# Altium footprint library MyPcbLib.PcbLib: 65 footprints (part 4 of 5)
Each footprint in its own frame and in the unit in brackets; x right, y up, seen from the top. Pads: shape width x height; smd on the part's side, far side on the other; paste and mask are expansions set on the pad; w line width, h text height; cw(c..) or ccw(c..) is an arc to the next point about the centre after c.
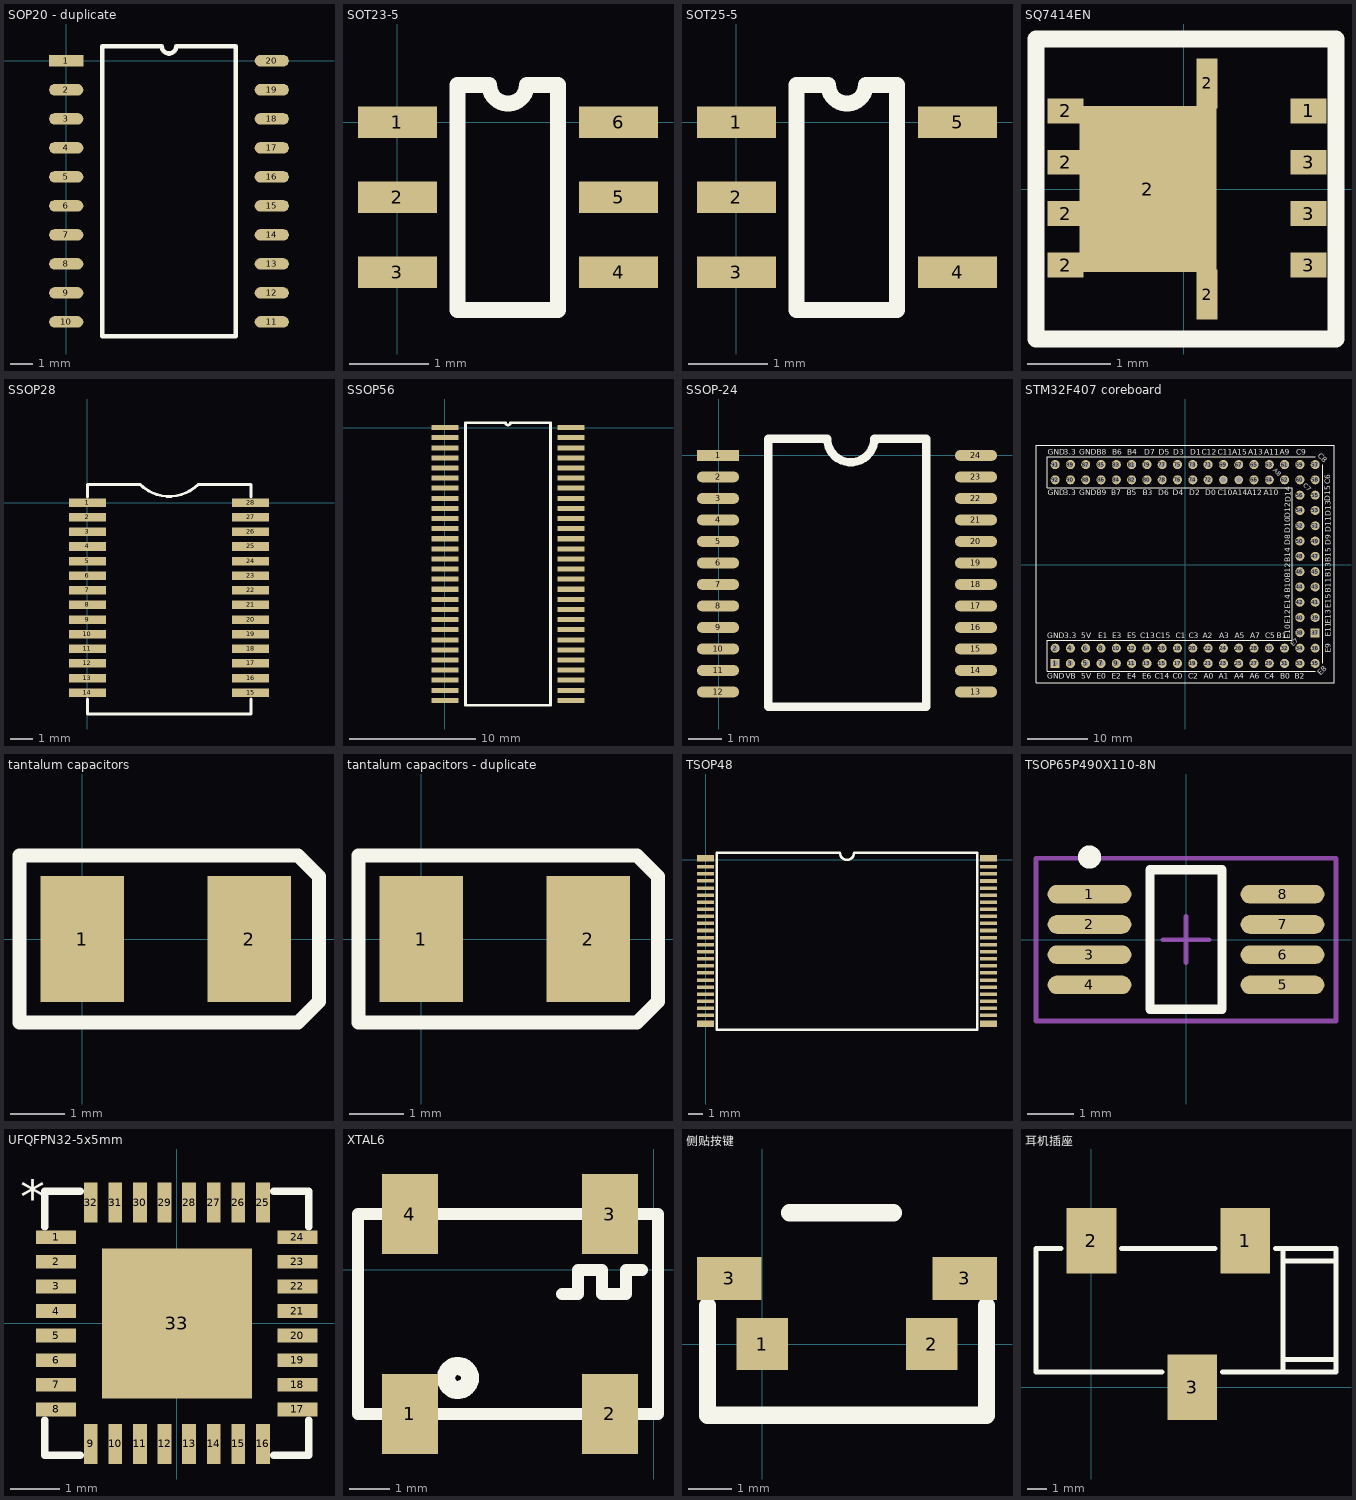
[diagram p3: the footprints below, top view; thin cyan lines are the x and y axes]

## SOP20 - duplicate [mm]
pads (20):
  rect 1.5x0.5 smd: 1(0,0)
  oval 1.5x0.5 smd: 2(0,-1.27) 3(0,-2.54) 4(0,-3.81) 5(0,-5.08) 6(0,-6.35) 7(0,-7.62) 8(0,-8.89) 9(0,-10.16) 10(0,-11.43) 11(9,-11.43) 12(9,-10.16) 13(9,-8.89) 14(9,-7.62) 15(9,-6.35) 16(9,-5.08) 17(9,-3.81) 18(9,-2.54) 19(9,-1.27) 20(9,0)
Top Overlay:
  lines w0.2: 1.585,-12.065 7.415,-12.065 7.415,0.635 4.818,0.635 cw(c4.5,0.635) 4.182,0.635 1.585,0.635 1.585,-12.065

## SOT23-5 [mm]
pads (6):
  rect 1x0.4 smd: 1(0,0) 2(0,-0.95) 3(0,-1.9) 4(2.8,-1.9) 5(2.8,-0.95) 6(2.8,0)
Top Overlay:
  lines w0.2: 0.762,-2.375 0.762,0.475 1.162,0.475 ccw(c1.4,0.475) 1.637,0.475 2.032,0.475 2.032,-2.375 0.762,-2.375

## SOT25-5 [mm]
pads (5):
  rect 1x0.4 smd: 1(0,0) 2(0,-0.95) 3(0,-1.9) 4(2.8,-1.9) 5(2.8,0)
Top Overlay:
  lines w0.2: 0.762,-2.375 2.032,-2.375 2.032,0.475 1.637,0.475 cw(c1.4,0.475) 1.162,0.475 0.762,0.475 0.762,-2.375

## SQ7414EN [mm] "MOS"
pads (11):
  rect 0.43x0.3 smd: 1(1.499,0.94) 2(-1.422,-0.914) 2(-1.422,-0.296) 2(-1.422,0.322) 2(-1.422,0.94) 3(1.499,-0.914) 3(1.499,-0.296) 3(1.499,0.322)
  rect 1.65x2 smd: 2(-0.432,0)
  rect 0.25x0.6 smd: 2(0.279,-1.27) 2(0.279,1.27)
Top Overlay:
  lines w0.2: -1.778,-1.803 -1.778,1.803 1.829,1.803 1.829,-1.803 -1.778,-1.803

## SSOP28 [mil]
height 62.99
pads (28):
  rect 65x15 smd: 1(0,0) 2(0,-25.59) 3(0,-51.18) 4(0,-76.77) 5(0,-102.36) 6(0,-127.95) 7(0,-153.54) 8(0,-179.13) 9(0,-204.72) 10(0,-230.31) 11(0,-255.91) 12(0,-281.5) 13(0,-307.09) 14(0,-332.68) 15(285.43,-332.68) 16(285.43,-307.09) 17(285.43,-281.5) 18(285.43,-255.91) 19(285.43,-230.31) 20(285.43,-204.72) 21(285.43,-179.13) 22(285.43,-153.54) 23(285.43,-127.95) 24(285.43,-102.36) 25(285.43,-76.77) 26(285.43,-51.18) 27(285.43,-25.59) 28(285.43,0)
Top Overlay:
  lines w5: 0,-344 0,-370.03 286,-370.03 286,-344 ; 0,10 0,32 92,32 ccw(c143,83) 194,32 286,32 286,10

## SSOP56 [mm]
pads (56):
  rect 2.15x0.4 smd: 1(0,0) 2(0,-0.8) 3(0,-1.6) 4(0,-2.4) 5(0,-3.2) 6(0,-4) 7(0,-4.8) 8(0,-5.6) 9(0,-6.4) 10(0,-7.2) 11(0,-8) 12(0,-8.8) 13(0,-9.6) 14(0,-10.4) 15(0,-11.2) 16(0,-12) 17(0,-12.8) 18(0,-13.6) 19(0,-14.4) 20(0,-15.2) 21(0,-16) 22(0,-16.8) 23(0,-17.6) 24(0,-18.4) 25(0,-19.2) 26(0,-20) 27(0,-20.8) 28(0,-21.6) 29(10,-21.6) 30(10,-20.8) 31(10,-20) 32(10,-19.2) 33(10,-18.4) 34(10,-17.6) 35(10,-16.8) 36(10,-16) 37(10,-15.2) 38(10,-14.4) 39(10,-13.6) 40(10,-12.8) 41(10,-12) 42(10,-11.2) 43(10,-10.4) 44(10,-9.6) 45(10,-8.8) 46(10,-8) 47(10,-7.2) 48(10,-6.4) 49(10,-5.6) 50(10,-4.8) 51(10,-4) 52(10,-3.2) 53(10,-2.4) 54(10,-1.6) 55(10,-0.8) 56(10,0)
Top Overlay:
  lines w0.2: 1.635,-22 8.365,-22 8.365,0.4 5.2,0.4 cw(c5,0.4) 4.8,0.4 1.635,0.4 1.635,-22

## SSOP-24 [mm]
pads (24):
  rect 1.27x0.33 smd: 1(-0.025,0)
  oval 1.27x0.33 smd: 2(-0.025,-0.65) 3(-0.025,-1.3) 4(-0.025,-1.95) 5(-0.025,-2.6) 6(-0.025,-3.25) 7(-0.025,-3.9) 8(-0.025,-4.55) 9(-0.025,-5.2) 10(-0.025,-5.85) 11(-0.025,-6.5) 12(-0.025,-7.15) 13(7.775,-7.15) 14(7.775,-6.5) 15(7.775,-5.85) 16(7.775,-5.2) 17(7.775,-4.55) 18(7.775,-3.9) 19(7.775,-3.25) 20(7.775,-2.6) 21(7.775,-1.95) 22(7.775,-1.3) 23(7.775,-0.65) 24(7.775,0)
Top Overlay:
  lines w0.254: 6.223,-7.6 1.499,-7.6 1.499,0.5 3.269,0.5 3.277,0.508 ccw(c3.99,0.508) 4.703,0.508 6.266,0.508 6.274,0.5 6.274,-7.6

## STM32F407 coreboard [mm]
pads (92):
  rect 1.5x1.5 hole 0.9: 1(-21.641,-16.383) 37(21.539,-11.303)
  round 1.5 hole 0.9: 2(-21.641,-13.843) 3(-19.101,-16.383) 4(-19.101,-13.843) 5(-16.561,-16.383) 6(-16.561,-13.843) 7(-14.021,-16.383) 8(-14.021,-13.843) 9(-11.481,-16.383) 10(-11.481,-13.843) 11(-8.941,-16.383) 12(-8.941,-13.843) 13(-6.401,-16.383) 14(-6.401,-13.843) 15(-3.861,-16.383) 16(-3.861,-13.843) 17(-1.321,-16.383) 18(-1.321,-13.843) 19(1.219,-16.383) 20(1.219,-13.843) 21(3.759,-16.383) 22(3.759,-13.843) 23(6.299,-16.383) 24(6.299,-13.843) 25(8.839,-16.383) 26(8.839,-13.843) 27(11.379,-16.383) 28(11.379,-13.843) 29(13.919,-16.383) 30(13.919,-13.843) 31(16.459,-16.383) 32(16.459,-13.843) 33(18.999,-16.383) 34(18.999,-13.843) 35(21.539,-16.383) 36(21.539,-13.843) 38(18.999,-11.303) 39(21.539,-8.763) 40(18.999,-8.763) 41(21.539,-6.223) 42(18.999,-6.223) 43(21.539,-3.683) 44(18.999,-3.683) 45(21.539,-1.143) 46(18.999,-1.143) 47(21.539,1.397) 48(18.999,1.397) 49(21.539,3.937) 50(18.999,3.937) 51(21.539,6.477) 52(18.999,6.477) 53(21.539,9.017) 54(18.999,9.017) 55(21.539,11.557) 56(18.999,11.557) 57(21.539,16.637) 58(21.539,14.097) 59(18.999,16.637) 60(18.999,14.097) 61(16.459,16.637) 62(16.459,14.097) 63(13.919,16.637) 64(13.919,14.097) 65(11.379,16.637) 66(11.379,14.097) 67(8.839,16.637) 69(6.299,16.637) 71(3.759,16.637) 72(3.759,14.097) 73(1.219,16.637) 74(1.219,14.097) 75(-1.321,16.637) 76(-1.321,14.097) 77(-3.861,16.637) 78(-3.861,14.097) 79(-6.401,16.637) 80(-6.401,14.097) 81(-8.941,16.637) 82(-8.941,14.097) 83(-11.481,16.637) 84(-11.481,14.097) 85(-14.021,16.637) 86(-14.021,14.097) 87(-16.561,16.637) 88(-16.561,14.097) 89(-19.101,16.637) 90(-19.101,14.097) 91(-21.641,16.637) 92(-21.641,14.097)
  round 1.4 hole 0.9: 68(8.839,14.097) 70(6.299,14.097)
Top Overlay:
  lines w0.2: 21.539,-17.653 -22.911,-17.653 -22.911,-12.573 17.729,-12.573 17.729,-10.668 17.729,12.827 -22.911,12.827 -22.911,17.907 21.539,17.907 ; 22.809,-16.383 22.809,-12.573 22.809,-10.668 22.809,12.827 22.809,16.637
  lines w0.203: -24.816,-19.558 -24.816,19.812 24.714,19.812 24.714,-19.558 -24.816,-19.558
  text "GND" at -22.853,18.288 h0.89
  text "GND" at -22.853,11.557 h0.89
  text "3.3" at -20.186,11.557 h0.89
  text "3.3" at -20.186,18.288 h0.89
  text "GND" at -17.646,18.288 h0.89
  text "GND" at -17.646,11.557 h0.89
  text "GND" at -22.911,-12.192 h0.89
  text "3.3" at -20.117,-12.192 h0.89
  text "5V" at -17.265,-12.192 h0.89
  text "GND" at -22.911,-18.923 h0.89
  text "VB" at -19.863,-18.923 h0.89
  text "5V" at -17.323,-18.923 h0.89
  text "E0" at -14.725,-18.923 h0.89
  text "E1" at -14.471,-12.192 h0.89
  text "E2" at -12.243,-18.923 h0.89
  text "E3" at -12.185,-12.192 h0.89
  text "E4" at -9.703,-18.923 h0.89
  text "E5" at -9.645,-12.192 h0.89
  text "E6" at -7.163,-18.923 h0.89
  text "C13" at -7.486,-12.192 h0.89
  text "C14" at -5.131,-18.923 h0.89
  text "C15" at -4.946,-12.192 h0.89
  text "C0" at -2.083,-18.923 h0.89
  text "C1" at -1.644,-12.192 h0.89
  text "C2" at 0.457,-18.923 h0.89
  text "C3" at 0.515,-12.192 h0.89
  text "A0" at 2.997,-18.923 h0.89
  text "A1" at 5.537,-18.923 h0.89
  text "A2" at 2.873,-12.192 h0.89
  text "A3" at 5.595,-12.192 h0.89
  text "A4" at 8.077,-18.923 h0.89
  text "A5" at 8.2,-12.192 h0.89
  text "A6" at 10.675,-18.923 h0.89
  text "A7" at 10.75,-12.192 h0.89
  text "C4" at 13.157,-18.923 h0.89
  text "C5" at 13.215,-12.192 h0.89
  text "B0" at 15.755,-18.923 h0.89
  text "B1" at 15.189,-12.192 h0.89
  text "B2" at 18.168,-18.923 h0.89
  text "E7" at 17.914,-13.589 h0.76
  text "E8" at 22.486,-18.415 h0.89
  text "E9" at 24.105,-14.63 h0.89
  text "E11" at 24.105,-11.972 h0.89
  text "E10" at 17.399,-12.268 h0.89
  text "E13" at 24.105,-9.83 h0.89
  text "E12" at 17.399,-9.83 h0.89
  text "E15" at 24.105,-7.188 h0.89
  text "E14" at 17.399,-7.264 h0.89
  text "B11" at 24.105,-4.674 h0.89
  text "B10" at 17.399,-4.623 h0.89
  text "D9" at 24.105,3.277 h0.89
  text "D8" at 17.399,3.251 h0.89
  text "D11" at 24.105,5.41 h0.89
  text "D10" at 17.399,5.207 h0.89
  text "D13" at 24.105,8.052 h0.89
  text "D12" at 17.399,7.722 h0.89
  text "D14" at 17.475,10.414 h0.89
  text "D15" at 24.079,10.541 h0.89
  text "C6" at 24.079,13.335 h0.89
  text "C8" at 21.851,18.034 h0.89
  text "C7" at 19.507,13.081 h0.76
  text "C9" at 18.422,18.288 h0.89
  text "A8" at 14.485,15.621 h0.76
  text "A9" at 15.628,18.288 h0.89
  text "A10" at 12.979,11.557 h0.89
  text "A11" at 13.088,18.288 h0.89
  text "A12" at 10.294,11.557 h0.89
  text "A13" at 10.421,18.288 h0.89
  text "A14" at 7.881,11.557 h0.89
  text "A15" at 7.754,18.288 h0.89
  text "C10" at 5.341,11.557 h0.89
  text "C11" at 5.341,18.288 h0.89
  text "C12" at 2.674,18.288 h0.89
  text "D0" at 3.251,11.557 h0.89
  text "D1" at 0.769,18.288 h0.89
  text "D2" at 0.642,11.557 h0.89
  text "D3" at -2.025,18.288 h0.89
  text "D4" at -2.074,11.557 h0.89
  text "D5" at -4.438,18.288 h0.89
  text "D6" at -4.496,11.557 h0.89
  text "D7" at -6.851,18.288 h0.89
  text "B3" at -7.091,11.557 h0.89
  text "B4" at -9.645,18.288 h0.89
  text "B5" at -9.772,11.557 h0.89
  text "B6" at -12.185,18.288 h0.89
  text "B7" at -12.288,11.557 h0.89
  text "B8" at -14.725,18.288 h0.89
  text "B9" at -14.725,11.557 h0.89
  text "B13" at 24.105,-2.108 h0.89
  text "B12" at 17.399,-2.184 h0.89
  text "B15" at 24.105,0.457 h0.89
  text "B14" at 17.399,0.406 h0.89

## tantalum capacitors [mil]
pads (2):
  rect 60x90.55 smd: 1(0,0) 2(120,0)
Top Overlay:
  lines w10: -45,-60 155,-60 170,-45 170,45 155,60 -45,60 -45,-60

## tantalum capacitors - duplicate [mil]
pads (2):
  rect 60x90.55 smd: 1(0,0) 2(120,0)
Top Overlay:
  lines w10: -45,-60 -45,60 155,60 170,45 170,-45 155,-60 -45,-60

## TSOP48 [mm]
pads (48):
  rect 1.2x0.45 smd: 1(-0.021,0.108) 24(-0.021,-11.592) 25(19.979,-11.592) 48(19.979,0.108)
  rect 1.2x0.25 smd: 2(-0.021,-0.492) 3(-0.021,-0.992) 4(-0.021,-1.492) 5(-0.021,-1.992) 6(-0.021,-2.492) 7(-0.021,-2.992) 8(-0.021,-3.492) 9(-0.021,-3.992) 10(-0.021,-4.492) 11(-0.021,-4.992) 12(-0.021,-5.492) 13(-0.021,-5.992) 14(-0.021,-6.492) 15(-0.021,-6.992) 16(-0.021,-7.492) 17(-0.021,-7.992) 18(-0.021,-8.492) 19(-0.021,-8.992) 20(-0.021,-9.492) 21(-0.021,-9.992) 22(-0.021,-10.492) 23(-0.021,-10.992) 26(19.979,-10.992) 27(19.979,-10.492) 28(19.979,-9.992) 29(19.979,-9.492) 30(19.979,-8.992) 31(19.979,-8.492) 32(19.979,-7.992) 33(19.979,-7.492) 34(19.979,-6.992) 35(19.979,-6.492) 36(19.979,-5.992) 37(19.979,-5.492) 38(19.979,-4.992) 39(19.979,-4.492) 40(19.979,-3.992) 41(19.979,-3.492) 42(19.979,-2.992) 43(19.979,-2.492) 44(19.979,-1.992) 45(19.979,-1.492) 46(19.979,-0.992) 47(19.979,-0.492)
Top Overlay:
  lines w0.178: 0.779,-11.992 0.779,0.508 9.479,0.508 ccw(c9.979,0.508) 10.479,0.508 19.179,0.508 19.179,-11.992 0.779,-11.992

## TSOP65P490X110-8N [mm] "TSOP, 8-Leads, Body 3.0x3.0mm (max), Pitch 0.65mm, IPC Medium Density"
height 1.1
pads (8):
  oval 1.8x0.4 smd: 1(-2.075,0.975) 2(-2.075,0.325) 3(-2.075,-0.325) 4(-2.075,-0.975) 5(2.075,-0.975) 6(2.075,-0.325) 7(2.075,0.325) 8(2.075,0.975)
Top Overlay:
  circle w0.25: c-2.075,1.775 r0.125
  lines w0.2: -0.775,-1.5 0.775,-1.5 0.775,1.5 -0.775,1.5 -0.775,-1.5
Mechanical 15:
  lines w0.1: -0.5,0 0.5,0 ; 0,-0.5 0,0.5 ; -3.225,-1.75 3.225,-1.75 3.225,1.75 -3.225,1.75 -3.225,-1.75

## UFQFPN32-5x5mm [mil]
pads (33):
  rect 32x11 smd: 1(-96.5,68.9) 2(-96.5,49.21) 3(-96.5,29.53) 4(-96.5,9.84) 5(-96.5,-9.84) 6(-96.5,-29.53) 7(-96.5,-49.21) 8(-96.5,-68.9) 17(96.5,-68.9) 18(96.5,-49.21) 19(96.5,-29.53) 20(96.5,-9.84) 21(96.5,9.84) 22(96.5,29.53) 23(96.5,49.21) 24(96.5,68.9)
  rect 11x32 smd: 9(-68.9,-96.5) 10(-49.21,-96.5) 11(-29.53,-96.5) 12(-9.84,-96.5) 13(9.84,-96.5) 14(29.53,-96.5) 15(49.21,-96.5) 16(68.9,-96.5) 25(68.9,96.5) 26(49.21,96.5) 27(29.53,96.5) 28(9.84,96.5) 29(-9.84,96.5) 30(-29.53,96.5) 31(-49.21,96.5) 32(-68.9,96.5)
  rect 120x120 smd paste-70.5: 33(0,0)
Top Overlay:
  lines w6: -105.5,-77.4 -105.5,-105.5 -77.4,-105.5 ; -105.5,77.4 -105.5,105.5 -77.4,105.5 ; 77.4,-105.5 105.5,-105.5 105.5,-77.4 ; 77.4,105.5 105.5,105.5 105.5,77.4
  text "*" at -125,77.4 h50
Top Paste:
  region: 67.06,-3.94 3.94,-3.94 3.94,-67.06 67.06,-67.06
  region: 67.06,67.06 3.94,67.06 3.94,3.94 67.06,3.94
  region: -3.94,-3.94 -67.06,-3.94 -67.06,-67.06 -3.94,-67.06
  region: -3.94,67.06 -67.06,67.06 -67.06,3.94 -3.94,3.94
3D body "UFQFPN32-5x5mm.stp": height 24.1, standoff 2, extent -100.49,-100.49 100.51,100.51

## XTAL6 [mm]
pads (4):
  rect 1.4x2 smd: 1(-6.096,-3.603) 2(-1.096,-3.603) 3(-1.096,1.397) 4(-6.096,1.397)
Top Overlay:
  circle w0.254: c-4.896,-2.703 r0.4
  circle w0.254: c-4.896,-2.703 r0.2
  lines w0.305: -2.296,-0.603 -1.896,-0.603 -1.896,-0.003 -1.296,-0.003 -1.296,-0.603 -0.796,-0.603 -0.696,-0.603 -0.696,-0.003 -0.296,-0.003 ; -7.396,-3.603 -7.396,1.397 0.104,1.397 0.104,-3.603 -7.396,-3.603

## 侧贴按键 [mm]
pads (4):
  rect 1.2x1.2 smd: 1(0,0) 2(3.937,0)
  rect 1.5x1 smd: 3(-0.762,1.524) 3(4.699,1.524)
Top Overlay:
  lines w0.4: -1.27,0.889 -1.27,-1.651 5.207,-1.651 5.207,0.889 ; 0.635,3.048 3.048,3.048

## 耳机插座 [mm]
pads (3):
  rect 2.5x3.3 smd: 1(7.747,7.366) 2(0,7.366) 3(5.08,0)
Top Overlay:
  lines w0.254: -1.524,6.985 -2.794,6.985 -2.794,0.762 -0.889,0.762 ; -1.143,0.762 3.556,0.762 ; 1.524,6.985 6.223,6.985 ; 6.604,0.762 9.779,0.762 12.319,0.762 12.319,6.985 9.779,6.985 ; 9.271,6.985 10.16,6.985 ; 9.652,0.889 9.652,6.985 ; 9.652,6.35 12.319,6.35 ; 9.779,1.397 12.319,1.397